# Altium footprint library FlyControl.PcbLib: 23 footprints (part 1 of 2)
Each footprint in its own frame and in the unit in brackets; x right, y up, seen from the top. Pads: shape width x height; smd on the part's side, far side on the other; paste and mask are expansions set on the pad; w line width, h text height; cw(c..) or ccw(c..) is an arc to the next point about the centre after c.
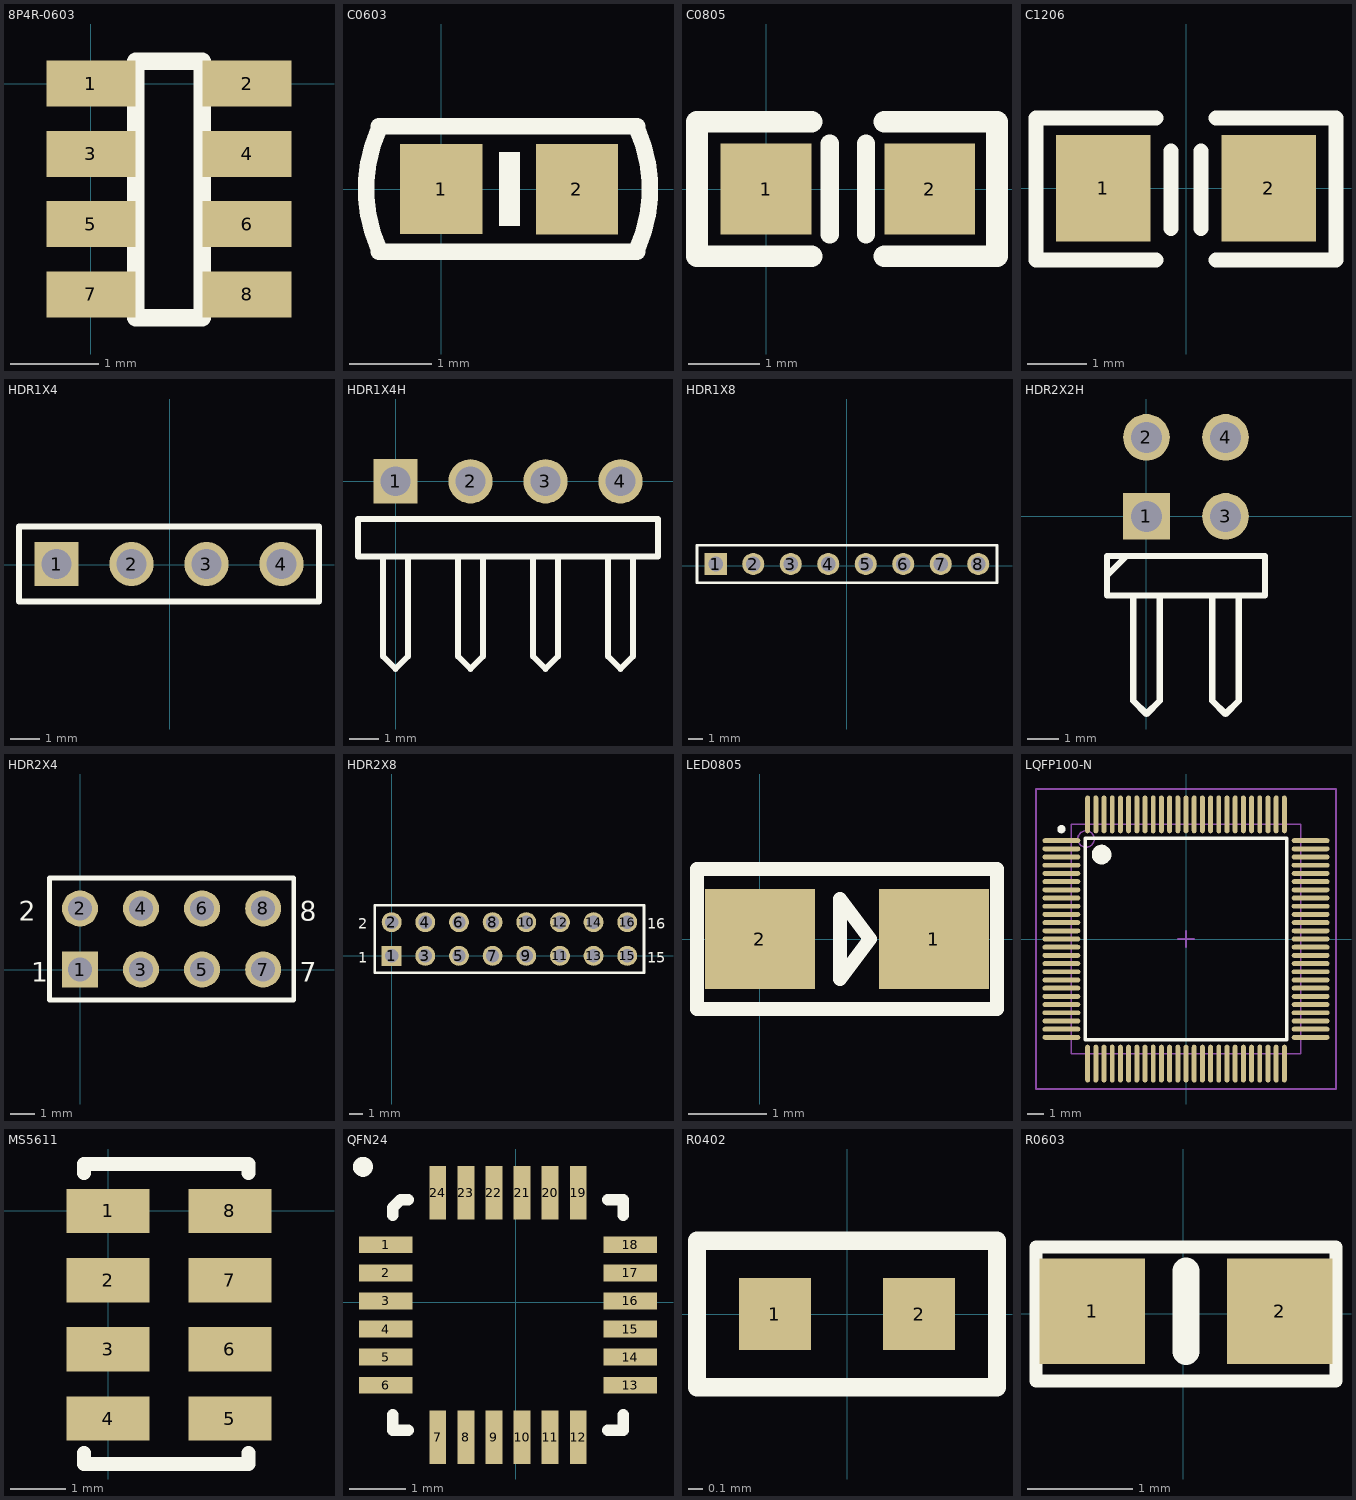
[diagram p0: the footprints below, top view; thin cyan lines are the x and y axes]

## 8P4R-0603 [mil]
pads (8):
  rect 40x20.62 smd: 1(0,0) 2(70,0) 3(0,-31.5) 4(70,-31.5) 5(0,-62.99) 6(70,-62.99) 7(0,-94.49) 8(70,-94.49)
Top Overlay:
  lines w7.87: 20,-105 20,10 50,10 50,-105 20,-105

## C0603 [mm]
pads (2):
  rect 1x1.1 smd: 1(0,0) 2(1.651,-0.002)
Top Overlay:
  region: 0.957,-0.449 0.957,0.449 0.703,0.449 0.703,-0.449
  lines w0.2: -0.761,-0.762 2.387,-0.762 ; -0.761,-0.727 cw(c0.861,0) -0.761,0.727 ; -0.761,0.762 2.387,0.762 ; 2.387,-0.727 ccw(c0.764,0) 2.387,0.727
3D body: height 0.9, standoff 0, extent 0.029,-0.404 1.629,0.406

## C0805 [mil]
pads (2):
  rect 50x50 smd: 1(0,0) 2(90,0)
Top Overlay:
  lines w10: 35,-25 35,25 ; 55,-25 55,25
  lines w12: 25,-37 -38,-37 -38,37 25,37 ; 65,-37 127,-37 127,37 65,37
3D body: height 19.51, standoff -0.57, extent 5,-23.82 83.74,23.82

## C1206 [mm]
pads (2):
  rect 1.6x1.8 smd: 1(-1.4,0) 2(1.4,0)
Top Overlay:
  lines w0.254: -0.508,-1.219 -2.54,-1.219 -2.54,1.194 -0.508,1.194 ; -0.254,-0.686 -0.254,0.635 ; 0.254,-0.686 0.254,0.635 ; 0.508,-1.219 2.54,-1.219 2.54,1.194 0.508,1.194
3D body: height 1.02, standoff 0.01, extent -1.575,-0.813 1.625,0.797

## HDR1X4 [mm]
pads (4):
  rect 1.5x1.5 hole 1: 1(-3.835,0.025)
  round 1.5 hole 1: 2(-1.295,0.025) 3(1.245,0.025) 4(3.785,0.025)
Top Overlay:
  lines w0.2: -5.105,-1.245 -5.105,1.295 5.055,1.295 5.055,-1.245 -5.105,-1.245
3D body: height 8.6, standoff -2.94, extent -5.105,-1.245 5.055,1.295

## HDR1X4H [mm]
pads (4):
  rect 1.5x1.5 hole 1: 1(0,0)
  round 1.5 hole 1: 2(2.54,0) 3(5.08,0) 4(7.62,0)
Top Overlay:
  lines w0.2: -0.423,-2.54 -0.423,-5.927 0,-6.35 0.423,-5.927 0.423,-2.54 ; 2.117,-2.54 2.117,-5.927 2.54,-6.35 2.963,-5.927 2.963,-2.54 ; 4.657,-2.54 4.657,-5.927 5.08,-6.35 5.503,-5.927 5.503,-2.54 ; 7.197,-2.54 7.197,-5.927 7.62,-6.35 8.043,-5.927 8.043,-2.54 ; -1.27,-2.54 -1.27,-1.27 8.89,-1.27 8.89,-2.54 -1.27,-2.54

## HDR1X8 [mm]
pads (8):
  rect 1.5x1.5 hole 1: 1(-8.865,0.102)
  round 1.5 hole 1: 2(-6.325,0.102) 3(-3.785,0.102) 4(-1.245,0.102) 5(1.295,0.102) 6(3.835,0.102) 7(6.375,0.102) 8(8.915,0.102)
Top Overlay:
  lines w0.2: -10.135,-1.168 -10.135,1.372 10.185,1.372 10.185,-1.168 -10.135,-1.168
3D body: height 8.6, standoff -2.94, extent -10.109,-1.168 10.211,1.372

## HDR2X2H [mm]
pads (4):
  rect 1.5x1.5 hole 1: 1(0,0)
  round 1.5 hole 1: 2(0,2.54) 3(2.54,0) 4(2.54,2.54)
Top Overlay:
  lines w0.2: -1.27,-1.905 -0.635,-1.27 ; -0.423,-2.54 -0.423,-5.927 0,-6.35 0.423,-5.927 0.423,-2.54 ; 2.117,-2.54 2.117,-5.927 2.54,-6.35 2.963,-5.927 2.963,-2.54 ; -1.27,-2.54 3.81,-2.54 3.81,-1.27 -1.27,-1.27 -1.27,-2.54

## HDR2X4 [mm]
pads (8):
  rect 1.5x1.5 hole 1: 1(0,0)
  round 1.5 hole 1: 2(0,2.54) 3(2.54,0) 4(2.54,2.54) 5(5.08,0) 6(5.08,2.54) 7(7.62,0) 8(7.62,2.54)
Top Overlay:
  lines w0.2: -1.27,-1.27 -1.27,3.81 8.89,3.81 8.89,-1.27 -1.27,-1.27
  text "8" at 9.144,2.032 h0.8
  text "7" at 9.144,-0.508 h0.8
  text "1" at -2.032,-0.508 h0.8
  text "2" at -2.54,2.032 h0.8

## HDR2X8 [mm]
pads (16):
  rect 1.5x1.5 hole 1: 1(0,0)
  round 1.5 hole 1: 2(0,2.54) 3(2.54,0) 4(2.54,2.54) 5(5.08,0) 6(5.08,2.54) 7(7.62,0) 8(7.62,2.54) 9(10.16,0) 10(10.16,2.54) 11(12.7,0) 12(12.7,2.54) 13(15.24,0) 14(15.24,2.54) 15(17.78,0) 16(17.78,2.54)
Top Overlay:
  lines w0.2: -1.27,-1.27 19.05,-1.27 19.05,3.81 -1.27,3.81 -1.27,-1.27
  text "16" at 19.304,2.032 h0.8
  text "15" at 19.304,-0.508 h0.8
  text "1" at -2.54,-0.508 h0.8
  text "2" at -2.54,2.032 h0.8

## LED0805 [mm]
pads (2):
  rect 1.4x1.27 smd: 1(2.21,0) 2(0,0)
Top Overlay:
  lines w0.178: 3.011,0.889 3.01,0.889 ; 3.01,0.889 -0.8,0.889 -0.8,0 -0.8,-0.889 3.01,-0.889 3.01,0.889 ; 1.016,-0.508 1.397,0 1.016,0.508 1.016,-0.508
3D body: height 0.8, standoff 0, extent 0.118,-0.715 2.218,0.635

## LQFP100-N [mm]
pads (100):
  oval 2.303x0.3 smd: 1(-7.6,6) 2(-7.6,5.5) 3(-7.6,5) 4(-7.6,4.5) 5(-7.6,4) 6(-7.6,3.5) 7(-7.6,3) 8(-7.6,2.5) 9(-7.6,2) 10(-7.6,1.5) 11(-7.6,1) 12(-7.6,0.5) 13(-7.6,0) 14(-7.6,-0.5) 15(-7.6,-1) 16(-7.6,-1.5) 17(-7.6,-2) 18(-7.6,-2.5) 19(-7.6,-3) 20(-7.6,-3.5) 21(-7.6,-4) 22(-7.6,-4.5) 23(-7.6,-5) 24(-7.6,-5.5) 25(-7.6,-6) 51(7.6,-6) 52(7.6,-5.5) 53(7.6,-5) 54(7.6,-4.5) 55(7.6,-4) 56(7.6,-3.5) 57(7.6,-3) 58(7.6,-2.5) 59(7.6,-2) 60(7.6,-1.5) 61(7.6,-1) 62(7.6,-0.5) 63(7.6,0) 64(7.6,0.5) 65(7.6,1) 66(7.6,1.5) 67(7.6,2) 68(7.6,2.5) 69(7.6,3) 70(7.6,3.5) 71(7.6,4) 72(7.6,4.5) 73(7.6,5) 74(7.6,5.5) 75(7.6,6)
  oval 0.3x2.303 smd: 26(-6,-7.6) 27(-5.5,-7.6) 28(-5,-7.6) 29(-4.5,-7.6) 30(-4,-7.6) 31(-3.5,-7.6) 32(-3,-7.6) 33(-2.5,-7.6) 34(-2,-7.6) 35(-1.5,-7.6) 36(-1,-7.6) 37(-0.5,-7.6) 38(0,-7.6) 39(0.5,-7.6) 40(1,-7.6) 41(1.5,-7.6) 42(2,-7.6) 43(2.5,-7.6) 44(3,-7.6) 45(3.5,-7.6) 46(4,-7.6) 47(4.5,-7.6) 48(5,-7.6) 49(5.5,-7.6) 50(6,-7.6) 76(6,7.6) 77(5.5,7.6) 78(5,7.6) 79(4.5,7.6) 80(4,7.6) 81(3.5,7.6) 82(3,7.6) 83(2.5,7.6) 84(2,7.6) 85(1.5,7.6) 86(1,7.6) 87(0.5,7.6) 88(0,7.6) 89(-0.5,7.6) 90(-1,7.6) 91(-1.5,7.6) 92(-2,7.6) 93(-2.5,7.6) 94(-3,7.6) 95(-3.5,7.6) 96(-4,7.6) 97(-4.5,7.6) 98(-5,7.6) 99(-5.5,7.6) 100(-6,7.6)
Top Overlay:
  circle w0.6: c-5.15,5.15 r0.3
  circle w0.25: c-7.6,6.7 r0.125
  lines w0.2: -6.15,-6.15 6.15,-6.15 6.15,6.15 -6.15,6.15 -6.15,-6.15
Mechanical 13:
  circle w0.1: c-6.1,6.1 r0.5
  lines w0.1: -7,-7 7,-7 7,7 -7,7 -7,-7
Mechanical 15:
  lines w0.1: -0.5,0 0.5,0 ; 0,-0.5 0,0.5 ; -9.15,-9.15 9.15,-9.15 9.15,9.15 -9.15,9.15 -9.15,-9.15
3D body: height 0.8, standoff 0, extent -7,-7 7,7

## MS5611 [mm]
pads (8):
  rect 1.5x0.8 smd: 1(0,0) 2(0,-1.25) 3(0,-2.5) 4(0,-3.75) 5(2.2,-3.75) 6(2.2,-2.5) 7(2.2,-1.25) 8(2.2,0)
Top Overlay:
  lines w0.254: -0.435,-4.372 -0.435,-4.572 2.54,-4.572 2.54,-4.372 ; -0.435,0.689 -0.435,0.849 2.54,0.849 2.54,0.689

## QFN24 [mm]
pads (24):
  rect 0.95x0.3 smd: 1(-2.312,1.027) 2(-2.312,0.527) 3(-2.312,0.027) 4(-2.312,-0.473) 5(-2.312,-0.973) 6(-2.312,-1.473) 13(2.038,-1.473) 14(2.038,-0.973) 15(2.038,-0.473) 16(2.038,0.027) 17(2.038,0.527) 18(2.038,1.027)
  rect 0.3x0.95 smd: 7(-1.387,-2.398) 8(-0.887,-2.398) 9(-0.387,-2.398) 10(0.113,-2.398) 11(0.613,-2.398) 12(1.113,-2.398) 19(1.113,1.952) 20(0.613,1.952) 21(0.113,1.952) 22(-0.387,1.952) 23(-0.887,1.952) 24(-1.387,1.952)
Top Overlay:
  circle w0.254: c-2.717,2.413 r0.05
  lines w0.2: -2.187,-1.998 -2.187,-2.273 -1.912,-2.273 ; -2.187,1.552 -2.187,1.69 -2.05,1.827 -1.912,1.827 ; 1.638,-2.273 1.913,-2.273 1.913,-1.998 ; 1.638,1.827 1.913,1.827 1.913,1.552
3D body: height 0.89, standoff 0, extent -2.159,-2.286 1.905,1.778

## R0402 [mm]
pads (2):
  rect 0.5x0.5 smd: 1(-0.5,0) 2(0.5,0)
Top Overlay:
  lines w0.127: 0.229,-0.508 1.041,-0.508 ; 1.041,-0.508 1.041,0.508 -1.041,0.508 -1.041,-0.508 1.041,-0.508
3D body: height 0.5, standoff -0.01, extent -0.483,-0.255 0.517,0.255

## R0603 [mm]
pads (2):
  rect 1x1 smd: 1(-0.864,0.025) 2(0.914,0.025)
Top Overlay:
  lines w0.127: -1.397,-0.635 1.448,-0.635 1.448,0.635 -1.397,0.635 -1.397,-0.635
  lines w0.254: 0.025,-0.356 0.025,0.406
3D body: height 0.91, standoff 0.01, extent -0.825,-0.378 0.775,0.432